# Altium footprint library ic.PcbLib: 108 footprints (part 1 of 7)
Each footprint in its own frame and in the unit in brackets; x right, y up, seen from the top. Pads: shape width x height; smd on the part's side, far side on the other; paste and mask are expansions set on the pad; w line width, h text height; cw(c..) or ccw(c..) is an arc to the next point about the centre after c.
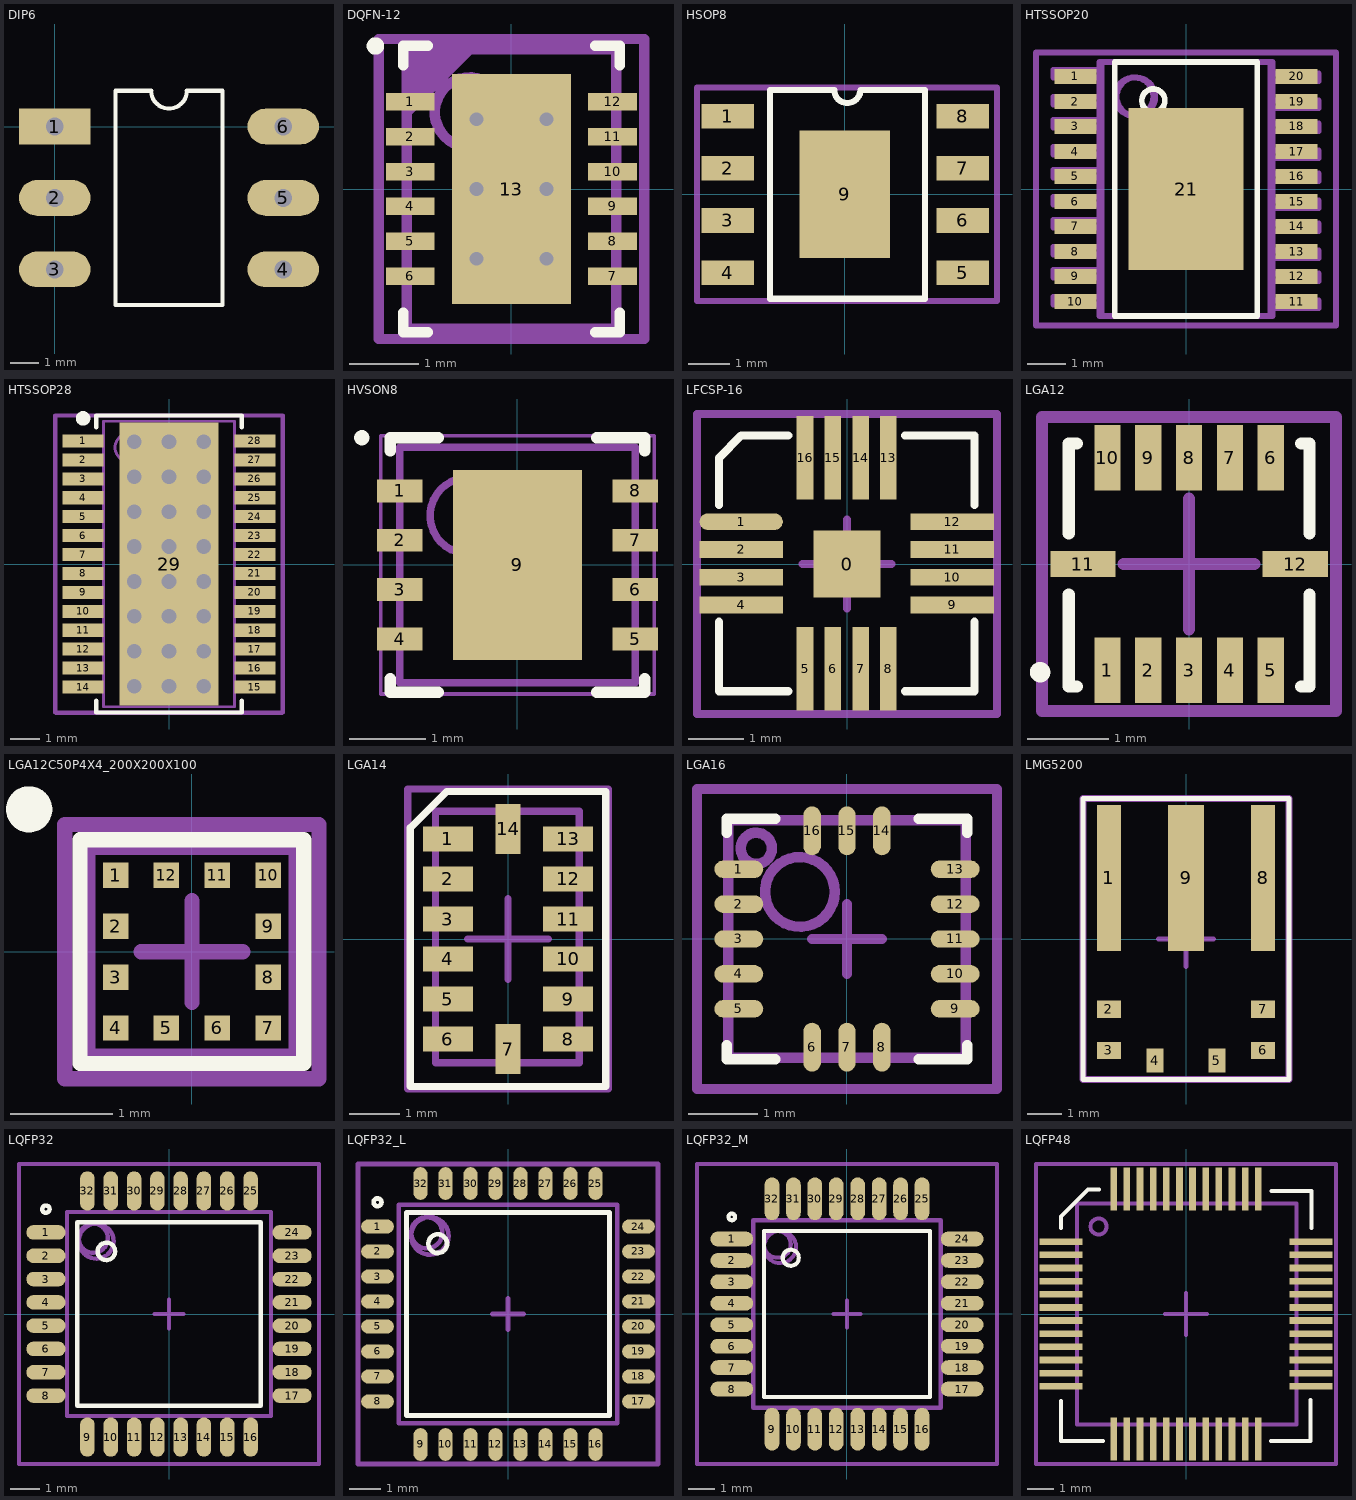
[diagram p0: the footprints below, top view; thin cyan lines are the x and y axes]

## DIP6 [mil]
pads (6):
  rect 100x50 hole 25: 1(0,0)
  oval 100x50 hole 25: 2(0,-100) 3(0,-200) 4(320,-200) 5(320,-100) 6(320,0)
Top Overlay:
  lines w5.91: 85,-250 85,50 135,50 ccw(c160,50) 185,50 235,50 235,-250 85,-250
3D body "User Library-DIP6.STEP": height 188.98, standoff -98.43, extent 5.08,-240.32 314.92,40

## DQFN-12 [mm] "SON, 12-Leads, Body 4x3mm, Pitch 0.5mm, Thermal Pad 3.3x1.7mm"
height 0.8
pads (13):
  rect 0.7x0.25 smd: 1(-1.45,1.25) 2(-1.45,0.75) 3(-1.45,0.25) 4(-1.45,-0.25) 5(-1.45,-0.75) 6(-1.45,-1.25) 7(1.45,-1.25) 8(1.45,-0.75) 9(1.45,-0.25) 10(1.45,0.25) 11(1.45,0.75) 12(1.45,1.25)
  rect 1.7x3.3 smd: 13(0,0)
via -0.5,1 diameter 0.5 hole 0.2
via 0.5,1 diameter 0.5 hole 0.2
via -0.5,0 diameter 0.5 hole 0.2
via 0.5,0 diameter 0.5 hole 0.2
via -0.5,-1 diameter 0.5 hole 0.2
via 0.5,-1 diameter 0.5 hole 0.2
Top Overlay:
  circle w0.15: c-1.95,2.05 r0.05
  lines w0.15: -1.55,-1.775 -1.55,-2.05 -1.2,-2.05 ; -1.55,1.775 -1.55,2.05 -1.2,2.05 ; 1.2,-2.05 1.55,-2.05 1.55,-1.775 ; 1.2,2.05 1.55,2.05 1.55,1.775
Top Courtyard:
  lines w0.15: -0.5,0 0.5,0 ; 0,-0.5 0,0.5 ; -1.9,-2.15 -1.9,2.15 1.9,2.15 1.9,-2.15 -1.9,-2.15
Mechanical 13:
  circle w0.15: c-0.6,1.1 r0.5
Mechanical 29:
  region: -1.5,1 -1.5,2 -0.5,2
  lines w0.15: -1.5,-2 -1.5,2 ; -1.5,-2 1.5,-2 ; -1.5,-2 1.5,-2 ; -1.5,-2 -1.5,2 ; -1.5,2 1.5,2 ; -1.5,2 1.5,2 ; 1.5,-2 1.5,2 ; 1.5,-2 1.5,2
  text ".Designator" at -1.4,-0.5 h1
3D body: height 0.8, standoff 0, extent -1.5,-2 1.5,2

## HSOP8 [mm]
pads (9):
  rect 1.27x0.6 smd: 1(-2.85,1.9) 2(-2.85,0.63) 3(-2.85,-0.64) 4(-2.85,-1.91) 5(2.866,-1.91) 6(2.866,-0.64) 7(2.866,0.63) 8(2.866,1.9)
  rect 2.2x3.1 all layers, no hole: 9(0,0)
Top Overlay:
  lines w0.15: -1.825,-2.545 1.95,-2.545 1.95,2.535 0.376,2.535 cw(c0.058,2.535) -0.259,2.535 -1.825,2.535 -1.825,-2.545
Top Courtyard:
  lines w0.15: -0.8,0 0,0 ; 0,-0.8 0,0 ; 0,0.8 0,0 ; 0.8,0 0,0 ; -3.6,-2.6 -3.6,2.6 3.7,2.6 3.7,-2.6 -3.6,-2.6
3D body "User Library-HSOP8.STEP": height 1.75, standoff 0, extent -3.05,-2.5 3.15,2.5

## HTSSOP20 [mm] "TSSOP, 20-Leads, Body 6,50x4,40mm, Pitch 0,65mm, IPC Medium Density"
height 1.2
pads (21):
  rect 1.1x0.4 smd: 1(-2.875,2.925) 2(-2.875,2.275) 3(-2.875,1.625) 4(-2.875,0.975) 5(-2.875,0.325) 6(-2.875,-0.325) 7(-2.875,-0.975) 8(-2.875,-1.625) 9(-2.875,-2.275) 10(-2.875,-2.925) 11(2.875,-2.925) 12(2.875,-2.275) 13(2.875,-1.625) 14(2.875,-0.975) 15(2.875,-0.325) 16(2.875,0.325) 17(2.875,0.975) 18(2.875,1.625) 19(2.875,2.275) 20(2.875,2.925)
  rect 3x4.2 smd: 21(0,0)
Top Overlay:
  circle w0.15: c-0.85,2.3 r0.3
  lines w0.15: -1.85,-3.3 1.85,-3.3 1.85,3.3 -1.85,3.3 -1.85,-3.3
  text "." at -2.9,3.6 h0.1
Top Courtyard:
  lines w0.15: -0.5,0 0.5,0 ; 0,-0.5 0,0.5 ; -3.9,-3.55 3.9,-3.55 3.9,3.55 -3.9,3.55 -3.9,-3.55
Mechanical 13:
  circle w0.15: c-1.35,2.4 r0.5
  lines w0.15: -2.25,-3.3 2.25,-3.3 2.25,3.3 -2.25,3.3 -2.25,-3.3
Mechanical 29:
  circle w0.15: c-1.3,2.4 r0.5
  lines w0.15: -2.2,-3 -3.45,-3 -3.45,-2.8 -2.2,-2.8 ; -2.2,-2.3 -3.45,-2.3 -3.45,-2.1 -2.2,-2.1 ; -2.2,-1.7 -3.45,-1.7 -3.45,-1.5 -2.2,-1.5 ; -2.2,-1 -3.45,-1 -3.45,-0.8 -2.2,-0.8 ; -2.2,-0.4 -3.45,-0.4 -3.45,-0.2 -2.2,-0.2 ; -2.2,0.3 -3.45,0.3 -3.45,0.5 -2.2,0.5 ; -2.2,0.9 -3.45,0.9 -3.45,1.1 -2.2,1.1 ; -2.2,1.6 -3.45,1.6 -3.45,1.8 -2.2,1.8 ; -2.2,2.2 -3.45,2.2 -3.45,2.4 -2.2,2.4 ; -2.2,2.9 -3.45,2.9 -3.45,3.1 -2.2,3.1 ; 2.2,-3.1 3.45,-3.1 3.45,-2.9 2.2,-2.9 ; 2.2,-2.4 3.45,-2.4 3.45,-2.2 2.2,-2.2 ; 2.2,-1.8 3.45,-1.8 3.45,-1.6 2.2,-1.6 ; 2.2,-1.1 3.45,-1.1 3.45,-0.9 2.2,-0.9 ; 2.2,-0.5 3.45,-0.5 3.45,-0.3 2.2,-0.3 ; 2.2,0.2 3.45,0.2 3.45,0.4 2.2,0.4 ; 2.2,0.8 3.45,0.8 3.45,1 2.2,1 ; 2.2,1.5 3.45,1.5 3.45,1.7 2.2,1.7 ; 2.2,2.1 3.45,2.1 3.45,2.3 2.2,2.3 ; 2.2,2.8 3.45,2.8 3.45,3 2.2,3 ; -2.2,-3.3 2.2,-3.3 2.2,3.3 -2.2,3.3 -2.2,-3.3
  text ".Designator" at -3.3,3.6 h1
3D body "TSSOP-20.step": height 1.2, standoff 0, extent -3.2,-3.3 3.2,3.3

## HTSSOP28 [mm] "HTSSOP-28, 28-Leads, Body 9,70x4,40mm, Pitch 0,65mm, Thermal Pad 9,70x3,40mm, IPC Medium Density"
height 1.2
pads (29):
  rect 1.4x0.45 smd: 1(-2.95,4.225) 2(-2.95,3.575) 3(-2.95,2.925) 4(-2.95,2.275) 5(-2.95,1.625) 6(-2.95,0.975) 7(-2.95,0.325) 8(-2.95,-0.325) 9(-2.95,-0.975) 10(-2.95,-1.625) 11(-2.95,-2.275) 12(-2.95,-2.925) 13(-2.95,-3.575) 14(-2.95,-4.225) 15(2.95,-4.225) 16(2.95,-3.575) 17(2.95,-2.925) 18(2.95,-2.275) 19(2.95,-1.625) 20(2.95,-0.975) 21(2.95,-0.325) 22(2.95,0.325) 23(2.95,0.975) 24(2.95,1.625) 25(2.95,2.275) 26(2.95,2.925) 27(2.95,3.575) 28(2.95,4.225)
  rect 3.4x9.7 smd mask+0: 29(0,0)
via 1.2,3 diameter 1 hole 0.5
via 1.2,4.2 diameter 1 hole 0.5
via 0,4.2 diameter 1 hole 0.5
via -1.2,4.2 diameter 1 hole 0.5
via -1.2,3 diameter 1 hole 0.5
via 0,3 diameter 1 hole 0.5
via 1.2,0.6 diameter 1 hole 0.5
via 1.2,1.8 diameter 1 hole 0.5
via 0,1.8 diameter 1 hole 0.5
via -1.2,1.8 diameter 1 hole 0.5
via -1.2,0.6 diameter 1 hole 0.5
via 0,0.6 diameter 1 hole 0.5
via -1.2,-4.2 diameter 1 hole 0.5
via -1.2,-3 diameter 1 hole 0.5
via -1.2,-1.8 diameter 1 hole 0.5
via -1.2,-0.6 diameter 1 hole 0.5
via 1.2,-0.6 diameter 1 hole 0.5
via 1.2,-1.8 diameter 1 hole 0.5
via 1.2,-3 diameter 1 hole 0.5
via 1.2,-4.2 diameter 1 hole 0.5
via 0,-4.2 diameter 1 hole 0.5
via 0,-3 diameter 1 hole 0.5
via 0,-1.8 diameter 1 hole 0.5
via 0,-0.6 diameter 1 hole 0.5
Top Overlay:
  circle w0.25: c-2.95,5 r0.125
  lines w0.15: -2.5,-4.7 -2.5,-5.1 2.5,-5.1 2.5,-4.7 ; -2.5,4.7 -2.5,5.1 2.5,5.1 2.5,4.7
Top Solder:
  rectangle: -1.8,-2.6 1.8,2.6
Top Courtyard:
  circle w0.1: c-1.35,4 r0.5
  lines w0.1: -2.25,-4.9 -2.25,4.9 2.25,4.9 2.25,-4.9 -2.25,-4.9
  lines w0.15: -0.8,0 0,0 ; 0,-0.8 0,0 ; 0,0.8 0,0 ; 0.8,0 0,0 ; -3.9,-5.1 3.9,-5.1 3.9,5.1 -3.9,5.1 -3.9,-5.1
Top 3D Body:
  lines w0.05: -3.9,-5.15 -3.9,5.15 3.9,5.15 3.9,-5.15 -3.9,-5.15
  lines w0.1: -0.5,0 0.5,0 ; 0,-0.5 0,0.5
3D body "HTSSOP-28.step": height 1.2, standoff 0, extent -3.2,-4.9 3.2,4.9

## HVSON8 [mm] "SON, 8-Leads, Body 3,00x3,00mm, Pitch 0,65mm, Thermal Pad 3,00x2,60mm, IPC High Density"
height 1
pads (9):
  rect 0.6x0.3 smd: 1(-1.55,0.975) 2(-1.55,0.325) 3(-1.55,-0.325) 4(-1.55,-0.975) 5(1.55,-0.975) 6(1.55,-0.325) 7(1.55,0.325) 8(1.55,0.975)
  rect 1.7x2.5 smd paste-1.3: 9(0,0)
Top Overlay:
  circle w0.1: c-2.05,1.675 r0.05
  lines w0.15: -1.675,-1.5 -1.675,-1.675 -1.045,-1.675 ; -1.675,1.5 -1.675,1.675 -1.045,1.675 ; 1.045,-1.675 1.675,-1.675 1.675,-1.5 ; 1.045,1.675 1.675,1.675 1.675,1.5
Top Paste:
  rectangle: -0.8,0.1 -0.1,1.2
  rectangle: -0.8,-1.2 -0.1,-0.1
  rectangle: 0.1,0.1 0.8,1.2
  rectangle: 0.1,-1.2 0.8,-0.1
Top Courtyard:
  lines w0.05: -1.8,-1.7 -1.8,1.7 1.8,1.7 1.8,-1.7 -1.8,-1.7
  lines w0.1: -0.5,0 0.5,0 ; 0,-0.5 0,0.5
Mechanical 13:
  circle w0.1: c-0.65,0.65 r0.5
  lines w0.1: -1.55,-1.55 -1.55,1.55 1.55,1.55 1.55,-1.55 -1.55,-1.55
3D body "HVSON8.step": height 1, standoff 0, extent -1.6,-1.55 1.6,1.55

## LFCSP-16 [mm]
pads (17):
  rect 1.2x1.2 smd: 0(0,0)
  oval 1.5x0.3 smd: 1(-1.905,0.762)
  rect 1.5x0.3 smd: 2(-1.905,0.262) 3(-1.905,-0.238) 4(-1.905,-0.738) 9(1.895,-0.738) 10(1.895,-0.238) 11(1.895,0.262) 12(1.895,0.762)
  rect 0.3x1.5 smd: 5(-0.755,-1.888) 6(-0.255,-1.888) 7(0.245,-1.888) 8(0.745,-1.888) 13(0.745,1.912) 14(0.245,1.912) 15(-0.255,1.912) 16(-0.755,1.912)
Top Overlay:
  lines w0.15: -2.305,-1.038 -2.305,-2.288 -1.055,-2.288 ; -2.305,1.062 -2.305,1.912 -1.905,2.312 -1.055,2.312 ; 1.045,-2.288 2.295,-2.288 2.295,-1.038 ; 1.045,2.312 2.295,2.312 2.295,1.062
  text "." at -1.855,1.837 h0.1
Top Courtyard:
  lines w0.15: -0.8,0 0,0 ; 0,-0.8 0,0 ; 0,0.8 0,0 ; 0.8,0 0,0 ; -2.7,-2.7 -2.7,2.7 2.7,2.7 2.7,-2.7 -2.7,-2.7
3D body "User Library-LFCSP-16-1.STEP": height 1, standoff 0, extent -2.1,-2.025 1.9,1.975

## LGA12 [mm]
height 0.9
pads (12):
  rect 0.32x0.8 smd: 1(-1,-1.3) 2(-0.5,-1.3) 3(0,-1.3) 4(0.5,-1.3) 5(1,-1.3) 6(1,1.3) 7(0.5,1.3) 8(0,1.3) 9(-0.5,1.3) 10(-1,1.3)
  rect 0.8x0.32 smd: 11(-1.3,0) 12(1.3,0)
Top Overlay:
  circle w0.15: c-1.825,-1.325 r0.05
  lines w0.15: -1.475,-0.375 -1.475,-1.5 -1.375,-1.5 ; -1.475,0.375 -1.475,1.475 -1.375,1.475 ; 1.375,-1.5 1.475,-1.5 1.475,-0.375 ; 1.375,1.475 1.475,1.475 1.475,0.375
Top Courtyard:
  lines w0.15: -0.8,0 0,0 ; 0,-0.8 0,0 ; 0,0.8 0,0 ; 0.8,0 0,0 ; -1.8,-1.8 1.8,-1.8 1.8,1.8 -1.8,1.8 -1.8,-1.8
3D body "LGA12.STEP": height 0.85, standoff 0, extent -1.5,-1.5 1.5,1.5

## LGA12C50P4X4_200X200X100 [mm] "LGA, 12-Leads, Body 2,00x2,00mmx1,00mm, Pitch 0,50mm"
height 1
pads (12):
  rect 0.25x0.25 smd: 1(-0.75,0.75) 2(-0.75,0.25) 3(-0.75,-0.25) 4(-0.75,-0.75) 5(-0.25,-0.75) 6(0.25,-0.75) 7(0.75,-0.75) 8(0.75,-0.25) 9(0.75,0.25) 10(0.75,0.75) 11(0.25,0.75) 12(-0.25,0.75)
Top Overlay:
  circle w0.254: c-1.6,1.4 r0.1
  lines w0.15: -1.1,-1.1 1.1,-1.1 1.1,1.1 -1.1,1.1 -1.1,-1.1
Top Courtyard:
  lines w0.15: -0.5,0 0.5,0 ; 0,-0.5 0,0.5 ; -1.25,-1.25 1.25,-1.25 1.25,1.25 -1.25,1.25 -1.25,-1.25
Mechanical 13:
  lines w0.1: -1,-1 1,-1 1,1 -1,1 -1,-1
3D body "LGA12C50P4X4_200X200X100.step": height 1, standoff 0, extent -1.075,-1.075 1.075,1.075

## LGA14 [mm]
height 0.9
pads (14):
  rect 1x0.5 smd: 1(-1.2,2) 2(-1.2,1.2) 3(-1.2,0.4) 4(-1.2,-0.4) 5(-1.2,-1.2) 6(-1.2,-2) 8(1.2,-2) 9(1.2,-1.2) 10(1.2,-0.4) 11(1.2,0.4) 12(1.2,1.2) 13(1.2,2)
  rect 0.5x1 smd: 7(0,-2.2) 14(0,2.2)
Top Overlay:
  lines w0.15: -1.95,-2.95 -1.95,2.225 -1.225,2.95 1.95,2.95 1.95,-2.95 -1.95,-2.95
  text "." at -1.85,2.825 h0.1
Top Courtyard:
  lines w0.15: -0.8,0 0,0 ; 0,-0.8 0,0 ; 0,0.8 0,0 ; 0.8,0 0,0 ; -2,-3 -2,3 2,3 2,-3 -2,-3
Mechanical 29:
  circle w0.15: c-0.925,2.025 r0.141
  lines w0.15: -1.45,-2.475 1.425,-2.475 1.425,2.55 -1.45,2.55 -1.45,-2.475
  text ".Designator" at 0.4,-2.3 h1
3D body "LGA14.STEP": height 1.1, standoff 0, extent -1.475,-2.5 1.525,2.5

## LGA16 [mm] "PQFN, 16-Leads, Body 3x3mm, Pitch 0.5mm, IPC Medium Density"
height 1
pads (16):
  oval 0.7x0.25 smd: 1(-1.55,1) 2(-1.55,0.5) 3(-1.55,0) 4(-1.55,-0.5) 5(-1.55,-1) 9(1.55,-1) 10(1.55,-0.5) 11(1.55,0) 12(1.55,0.5) 13(1.55,1)
  oval 0.25x0.7 smd: 6(-0.5,-1.55) 7(0,-1.55) 8(0.5,-1.55) 14(0.5,1.55) 15(0,1.55) 16(-0.5,1.55)
Top Overlay:
  lines w0.15: -1.725,-1.525 -1.725,-1.725 -1.025,-1.725 ; -1.725,1.525 -1.725,1.725 -1.025,1.725 ; 1.025,-1.725 1.725,-1.725 1.725,-1.525 ; 1.025,1.725 1.725,1.725 1.725,1.525
  text "." at -2.125,1.475 h0.1
Top Courtyard:
  lines w0.15: -0.5,0 0.5,0 ; 0,-0.5 0,0.5 ; -2.15,-2.15 -2.15,2.15 2.15,2.15 2.15,-2.15 -2.15,-2.15
Mechanical 13:
  circle w0.15: c-0.675,0.675 r0.5
Mechanical 29:
  circle w0.15: c-1.3,1.3 r0.224
  lines w0.15: -1.7,-1.7 -1.7,1.7 1.7,1.7 1.7,-1.7 -1.7,-1.7
  text ".Designator" at -1.5,-0.5 h1
3D body: height 1, standoff 0, extent -1.575,-1.575 1.575,1.575

## LMG5200 [mm] "QFM 6?8 mm"
height 2
pads (9):
  rect 0.7x4.25 smd: 1(-2.25,1.78) 8(2.25,1.78)
  rect 0.7x0.5 smd: 2(-2.25,-2.05) 3(-2.25,-3.25) 6(2.25,-3.25) 7(2.25,-2.05)
  rect 0.5x0.7 smd: 4(-0.9,-3.55) 5(0.9,-3.55)
  rect 1.05x4.25 smd: 9(0,1.78)
Top Overlay:
  lines w0.15: -3,-4.1 0,-4.1 3,-4.1 3,0 3,4.1 0,4.1 -3,4.1 -3,0 -3,-4.1
  text "." at -2.775,4.55 h0.1
Top Courtyard:
  lines w0.15: -0.8,0 0,0 ; 0,-0.8 0,0 ; 0,0.8 0,0 ; 0.8,0 0,0 ; -3,-4.1 -3,4.1 3,4.1 3,-4.1 -3,-4.1
Mechanical 29:
  lines w0.2: -3,-4.1 0,-4.1 3,-4.1 3,0 3,4.1 0,4.1 -3,4.1 -3,0 -3,-4.1
  text ".Designator" at 0.3,-3.7 h1
3D body: height 2, standoff 0.05, extent -3,-4 3,4
3D body: height 6.76, standoff -6.76, extent 1.1,-1 1.1,-1

## LQFP32 [mm] "TQFP, 32-Leads, Body 7,00x7,00mm, Pitch 0,80mm, IPC Medium Density"
height 1.5
pads (32):
  oval 1.35x0.5 smd: 1(-4.225,2.8) 2(-4.225,2) 3(-4.225,1.2) 4(-4.225,0.4) 5(-4.225,-0.4) 6(-4.225,-1.2) 7(-4.225,-2) 8(-4.225,-2.8) 17(4.225,-2.8) 18(4.225,-2) 19(4.225,-1.2) 20(4.225,-0.4) 21(4.225,0.4) 22(4.225,1.2) 23(4.225,2) 24(4.225,2.8)
  oval 0.5x1.35 smd: 9(-2.8,-4.225) 10(-2,-4.225) 11(-1.2,-4.225) 12(-0.4,-4.225) 13(0.4,-4.225) 14(1.2,-4.225) 15(2,-4.225) 16(2.8,-4.225) 25(2.8,4.225) 26(2,4.225) 27(1.2,4.225) 28(0.4,4.225) 29(-0.4,4.225) 30(-1.2,4.225) 31(-2,4.225) 32(-2.8,4.225)
Top Overlay:
  circle w0.15: c-4.225,3.6 r0.125
  circle w0.15: c-2.15,2.15 r0.3
  lines w0.15: -3.15,-3.15 -3.15,3.15 3.15,3.15 3.15,-3.15 -3.15,-3.15
Top Courtyard:
  lines w0.15: -0.5,0 0.5,0 ; 0,-0.5 0,0.5 ; -5.15,-5.15 -5.15,5.15 5.15,5.15 5.15,-5.15 -5.15,-5.15
Mechanical 13:
  circle w0.15: c-2.6,2.6 r0.5
  lines w0.15: -3.5,-3.5 -3.5,3.5 3.5,3.5 3.5,-3.5 -3.5,-3.5
Mechanical 29:
  circle w0.15: c-2.5,2.5 r0.6
  lines w0.15: -3.5,-3.5 3.5,-3.5 3.5,3.5 -3.5,3.5 -3.5,-3.5
  text ".Designator" at -2.7,-0.3 h1
3D body: height 1.5, standoff 0.1, extent -3.5,-3.5 3.5,3.5

## LQFP32_L [mm] "TQFP, 32-Leads, Body 7,00x7,00mm, Pitch 0,80mm, IPC High Density"
height 1.5
pads (32):
  oval 1.05x0.45 smd: 1(-4.175,2.8) 2(-4.175,2) 3(-4.175,1.2) 4(-4.175,0.4) 5(-4.175,-0.4) 6(-4.175,-1.2) 7(-4.175,-2) 8(-4.175,-2.8) 17(4.175,-2.8) 18(4.175,-2) 19(4.175,-1.2) 20(4.175,-0.4) 21(4.175,0.4) 22(4.175,1.2) 23(4.175,2) 24(4.175,2.8)
  oval 0.45x1.05 smd: 9(-2.8,-4.175) 10(-2,-4.175) 11(-1.2,-4.175) 12(-0.4,-4.175) 13(0.4,-4.175) 14(1.2,-4.175) 15(2,-4.175) 16(2.8,-4.175) 25(2.8,4.175) 26(2,4.175) 27(1.2,4.175) 28(0.4,4.175) 29(-0.4,4.175) 30(-1.2,4.175) 31(-2,4.175) 32(-2.8,4.175)
Top Overlay:
  circle w0.15: c-4.175,3.575 r0.125
  circle w0.15: c-2.25,2.25 r0.3
  lines w0.15: -3.25,-3.25 -3.25,3.25 3.25,3.25 3.25,-3.25 -3.25,-3.25
Top Courtyard:
  lines w0.15: -0.5,0 0.5,0 ; 0,-0.5 0,0.5 ; -4.8,-4.8 -4.8,4.8 4.8,4.8 4.8,-4.8 -4.8,-4.8
Mechanical 13:
  circle w0.15: c-2.6,2.6 r0.5
  lines w0.15: -3.5,-3.5 -3.5,3.5 3.5,3.5 3.5,-3.5 -3.5,-3.5
Mechanical 29:
  circle w0.15: c-2.5,2.5 r0.6
  lines w0.15: -3.5,-3.5 3.5,-3.5 3.5,3.5 -3.5,3.5 -3.5,-3.5
  text ".Designator" at -2.6,-0.3 h1
3D body: height 1.5, standoff 0.1, extent -3.5,-3.5 3.5,3.5

## LQFP32_M [mm] "TQFP, 32-Leads, Body 7,00x7,00mm, Pitch 0,80mm, IPC Low Density"
height 1.5
pads (32):
  oval 1.6x0.55 smd: 1(-4.3,2.8) 2(-4.3,2) 3(-4.3,1.2) 4(-4.3,0.4) 5(-4.3,-0.4) 6(-4.3,-1.2) 7(-4.3,-2) 8(-4.3,-2.8) 17(4.3,-2.8) 18(4.3,-2) 19(4.3,-1.2) 20(4.3,-0.4) 21(4.3,0.4) 22(4.3,1.2) 23(4.3,2) 24(4.3,2.8)
  oval 0.55x1.6 smd: 9(-2.8,-4.3) 10(-2,-4.3) 11(-1.2,-4.3) 12(-0.4,-4.3) 13(0.4,-4.3) 14(1.2,-4.3) 15(2,-4.3) 16(2.8,-4.3) 25(2.8,4.3) 26(2,4.3) 27(1.2,4.3) 28(0.4,4.3) 29(-0.4,4.3) 30(-1.2,4.3) 31(-2,4.3) 32(-2.8,4.3)
Top Overlay:
  circle w0.15: c-4.3,3.625 r0.125
  circle w0.15: c-2.1,2.1 r0.3
  lines w0.15: -3.1,-3.1 -3.1,3.1 3.1,3.1 3.1,-3.1 -3.1,-3.1
Top Courtyard:
  lines w0.15: -0.5,0 0.5,0 ; 0,-0.5 0,0.5 ; -5.6,-5.6 -5.6,5.6 5.6,5.6 5.6,-5.6 -5.6,-5.6
Mechanical 13:
  circle w0.15: c-2.6,2.6 r0.5
  lines w0.15: -3.5,-3.5 -3.5,3.5 3.5,3.5 3.5,-3.5 -3.5,-3.5
Mechanical 29:
  circle w0.15: c-2.5,2.5 r0.6
  lines w0.15: -3.5,-3.5 -3.5,3.5 3.5,3.5 3.5,-3.5 -3.5,-3.5
  text ".Designator" at -2.8,-0.3 h1
3D body: height 1.5, standoff 0.1, extent -3.5,-3.5 3.5,3.5

## LQFP48 [mm]
pads (48):
  rect 1.65x0.254 smd: 1(-4.75,2.75) 2(-4.75,2.25) 3(-4.75,1.75) 4(-4.75,1.25) 5(-4.75,0.75) 6(-4.75,0.25) 7(-4.75,-0.25) 8(-4.75,-0.75) 9(-4.75,-1.25) 10(-4.75,-1.75) 11(-4.75,-2.25) 12(-4.75,-2.75) 25(4.75,-2.75) 26(4.75,-2.25) 27(4.75,-1.75) 28(4.75,-1.25) 29(4.75,-0.75) 30(4.75,-0.25) 31(4.75,0.25) 32(4.75,0.75) 33(4.75,1.25) 34(4.75,1.75) 35(4.75,2.25) 36(4.75,2.75)
  rect 0.254x1.65 smd: 13(-2.75,-4.75) 14(-2.25,-4.75) 15(-1.75,-4.75) 16(-1.25,-4.75) 17(-0.75,-4.75) 18(-0.25,-4.75) 19(0.25,-4.75) 20(0.75,-4.75) 21(1.25,-4.75) 22(1.75,-4.75) 23(2.25,-4.75) 24(2.75,-4.75) 37(2.75,4.75) 38(2.25,4.75) 39(1.75,4.75) 40(1.25,4.75) 41(0.75,4.75) 42(0.25,4.75) 43(-0.25,4.75) 44(-0.75,4.75) 45(-1.25,4.75) 46(-1.75,4.75) 47(-2.25,4.75) 48(-2.75,4.75)
Top Overlay:
  lines w0.15: -4.75,-3.3 -4.75,-4.825 -3.15,-4.825 ; -4.75,3.275 -4.75,3.7 -3.725,4.725 -3.3,4.725 ; 3.225,-4.825 4.725,-4.825 4.725,-3.275 ; 3.25,4.675 4.775,4.675 4.775,3.275
Top Courtyard:
  lines w0.15: -0.8,0 0,0 ; 0,-0.8 0,0 ; 0,0.8 0,0 ; 0.8,0 0,0 ; -5.7,-5.7 -5.7,5.7 5.7,5.7 5.7,-5.7 -5.7,-5.7
Mechanical 29:
  circle w0.15: c-3.325,3.325 r0.305
  lines w0.15: -4.15,-4.2 -4.15,4.2 4.2,4.2 4.2,-4.2 -4.15,-4.2
  text ".Designator" at -3.1,-0.2 h1
3D body "User Library-Quad50M48.step": height 1.56, standoff 0, extent -4.5,-4.511 4.5,4.489